# Altium footprint library ACTION标准库.pcblib: 504 footprints (part 26 of 32)
Each footprint in its own frame and in the unit in brackets; x right, y up, seen from the top. Pads: shape width x height; smd on the part's side, far side on the other; paste and mask are expansions set on the pad; w line width, h text height; cw(c..) or ccw(c..) is an arc to the next point about the centre after c.
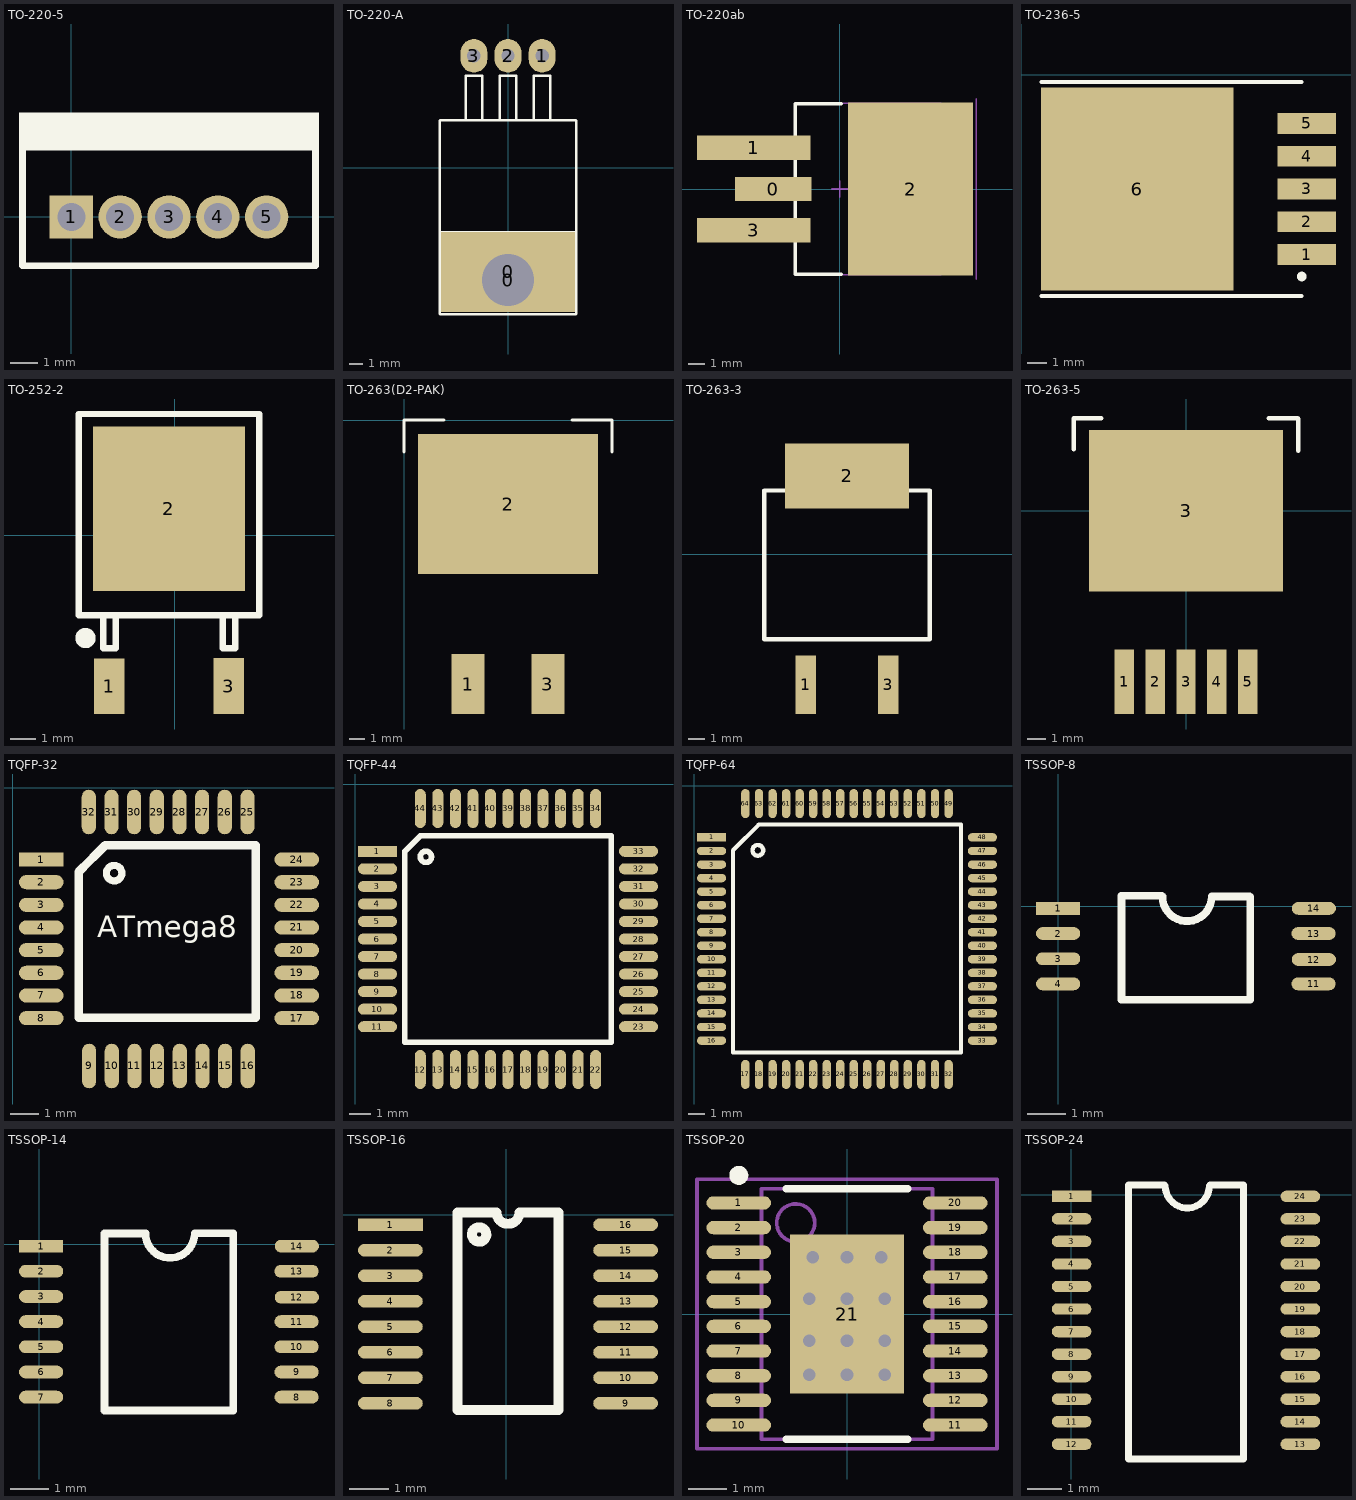
[diagram p25: the footprints below, top view; thin cyan lines are the x and y axes]

## TO-220-5 [mil]
pads (5):
  rect 62x62 hole 40: 1(0,0)
  round 62 hole 40: 2(70,0) 3(140,0) 4(210,0) 5(280,0)
Top Overlay:
  rectangle: -75,100 355,150
  lines w10: -70,-70 -70,100 350,100 350,-70 -70,-70
3D body "TO-220-5.STEP": height 269.78, standoff -143.39, extent -58.04,-786.01 342.04,8

## TO-220-A [mm]
pads (5):
  rect 10x6 smd: 0(0,-7.759)
  round 2 hole 3.88: 0(0,-8.37)
  oval 2x2.5 hole 1: 1(2.54,8.37) 2(0,8.37) 3(-2.54,8.37)
Top Overlay:
  lines w0.2: -5.08,-10.86 -5.08,-4.86 ; -5.08,-4.76 -5.08,3.52 ; -5.03,-10.91 5.03,-10.91 ; -5.03,-4.81 5.03,-4.81 ; -5.03,3.57 5.03,3.57 ; -3.15,3.57 -3.15,6.87 -1.93,6.87 -1.93,3.57 ; -0.61,3.57 -0.61,6.87 0.61,6.87 0.61,3.57 ; 1.93,3.57 1.93,6.87 3.15,6.87 3.15,3.57 ; 5.08,-10.86 5.08,-4.86 ; 5.08,-4.76 5.08,3.52
3D body "TO-220.step": height 4.45, standoff -1.79, extent -5.01,-10.69 5.15,8.59

## TO-220ab [mm] "D2-PAK, 1-Pads, Body 9.0x10.5mm (max), IPC Medium Density"
height 4.69
pads (4):
  rect 4.7x1.5 smd: 0(-4.1,0)
  rect 7x1.5 smd: 1(-5.3,2.54) 3(-5.3,-2.54)
  rect 7.7x10.65 smd: 2(4.35,0)
Top Overlay:
  lines w0.2: 0.1,-5.25 -2.75,-5.25 -2.75,5.25 0.1,5.25
Mechanical 13:
  lines w0.1: -2.75,-5.275 -2.75,5.275 6.25,5.275 6.25,-5.275 -2.75,-5.275
Mechanical 15:
  lines w0.1: -0.5,0 0.5,0 ; 0,-0.5 0,0.5 ; 8.4,-5.55 8.4,5.55

## TO-236-5 [mil] "SOT223, 6-Leads, Body 10.7x15.9mm (max), Pitch 1.70mm, IPC Medium Density"
height 177.17
pads (6):
  rect 120x42 smd: 1(583.28,-367.4) 2(583.28,-300.47) 3(583.28,-233.54) 4(583.28,-166.61) 5(583.28,-99.68)
  rect 393.7x414 smd: 6(237.28,-233.54)
Top Overlay:
  circle w9.84: c573.28,-412.32 r4.92
  lines w7.87: 41.79,-452.04 573.28,-452.04 ; 41.79,-15.03 573.28,-15.03
3D body "TO263-5.STEP": height 175.3, standoff -13.67, extent 15,-429.85 631.93,-36.15

## TO-252-2 [mm] "180度编带包装"
pads (3):
  rect 1.2x2.2 smd: 1(-2.59,-5.969) 3(2.133,-5.965)
  rect 6x6.5 smd: 2(-0.229,1.031)
Top Overlay:
  circle w0.4: c-3.529,-4.069 r0.2
  lines w0.254: -2.829,-3.169 -2.829,-4.469 -2.329,-4.469 -2.329,-3.169 ; 1.894,-3.165 1.894,-4.465 2.394,-4.465 2.394,-3.165 ; -3.802,-3.169 -3.802,4.781 3.344,4.781 3.344,-3.169 -3.802,-3.169
3D body "TO-252.STEP": height 2.44, standoff 0.03, extent -3.499,-6.169 3.041,3.769

## TO-263(D2-PAK) [mil]
pads (3):
  rect 82x150 smd: 1(160,-660) 3(360,-660)
  rect 450x350 smd: 2(260,-210)
Top Overlay:
  lines w8: 0,-80 0,0 100,0 ; 420,0 520,0 520,-80
3D body "SW3dPS-DPAK.STEP": height 193.9, standoff -3.66, extent 61,-638.71 461,-37.78

## TO-263-3 [mm]
height 1.1
pads (3):
  rect 1.25x3.6 smd: 1(8.255,-8.001) 3(13.335,-8.001)
  rect 7.6x4 smd: 2(10.795,4.826)
Top Overlay:
  lines w0.254: 5.715,-5.207 5.715,3.937 15.875,3.937 15.875,-5.207 5.715,-5.207
3D body "User Library-DPAK.step": height 4.88, standoff -0.13, extent 5.715,-9.041 15.875,6.223

## TO-263-5 [mil]
pads (6):
  rect 42x140 smd: 1(-134,-370) 2(-67,-370) 3(0,-370) 4(67,-370) 5(134,-370)
  rect 420x350 smd: 3(0,0)
Top Overlay:
  lines w10: -243,134 -243,201 -184,201 ; 179,201 242,201 243,200 243,130
3D body "TO263-5.STEP": height 185.3, standoff -3.67, extent -192.7,-424.47 201,192.47

## TQFP-32 [mil]
pads (32):
  rect 62x19.68 smd: 1(40,-100)
  oval 62x19.68 smd: 2(40,-131.5) 3(40,-162.99) 4(40,-194.49) 5(40,-225.98) 6(40,-257.48) 7(40,-288.98) 8(40,-320.47) 17(395,-320.47) 18(395,-288.98) 19(395,-257.48) 20(395,-225.98) 21(395,-194.49) 22(395,-162.99) 23(395,-131.5) 24(395,-100)
  oval 19.68x62 smd: 9(106.51,-387) 10(138.01,-387) 11(169.5,-387) 12(201,-387) 13(232.5,-387) 14(263.99,-387) 15(295.49,-387) 16(326.98,-387) 25(326.52,-33.95) 26(295.02,-33.95) 27(263.53,-33.95) 28(232.03,-33.95) 29(200.53,-33.95) 30(169.04,-33.95) 31(137.54,-33.95) 32(106.05,-33.95)
Top Overlay:
  circle w10: c141.23,-119 r10.77
  lines w12: 93,-116 129,-80 338,-80 338,-320 92,-320 92,-117 98.99,-110.01
  text "ATmega8" at 118,-208 h30
3D body "TQFP-9X9-32.STEP": height 62.99, standoff -1.97, extent 39.84,-387.33 394.16,-33

## TQFP-44 [mil]
pads (44):
  rect 70x19.68 smd: 1(40,-120)
  oval 70x19.68 smd: 2(40,-151.5) 3(40,-182.99) 4(40,-214.49) 5(40,-245.98) 6(40,-277.48) 7(40,-308.98) 8(40,-340.47) 9(40,-371.97) 10(40,-403.46) 11(40,-434.96) 23(508.5,-434.96) 24(508.5,-403.46) 25(508.5,-371.97) 26(508.5,-340.47) 27(508.5,-308.98) 28(508.5,-277.48) 29(508.5,-245.98) 30(508.5,-214.49) 31(508.5,-182.99) 32(508.5,-151.5) 33(508.5,-120)
  oval 19.68x70 smd: 12(116.77,-511.73) 13(148.27,-511.73) 14(179.76,-511.73) 15(211.26,-511.73) 16(242.76,-511.73) 17(274.25,-511.73) 18(305.75,-511.73) 19(337.24,-511.73) 20(368.74,-511.73) 21(400.24,-511.73) 22(431.73,-511.73) 34(431.73,-43.23) 35(400.24,-43.23) 36(368.74,-43.23) 37(337.24,-43.23) 38(305.75,-43.23) 39(274.25,-43.23) 40(242.76,-43.23) 41(211.26,-43.23) 42(179.76,-43.23) 43(148.27,-43.23) 44(116.77,-43.23)
Top Overlay:
  circle w10: c126.95,-130 r10.05
  lines w9.84: 89.21,-462.52 459.29,-462.52 459.29,-92.44
  lines w10: 89.21,-462.52 89.21,-120 116.77,-92.44 459.29,-92.44
3D body "TQFP-44.STEP": height 42.69, standoff -1.02, extent 39.79,-515.21 512.23,-42.77

## TQFP-64 [mm]
pads (64):
  rect 1.724x0.5 smd: 1(1.016,-3.044)
  oval 1.724x0.5 smd: 2(1.016,-3.844) 3(1.016,-4.644) 4(1.016,-5.444) 5(1.016,-6.244) 6(1.016,-7.044) 7(1.016,-7.844) 8(1.016,-8.644) 9(1.016,-9.444) 10(1.016,-10.244) 11(1.016,-11.044) 12(1.016,-11.844) 13(1.016,-12.644) 14(1.016,-13.444) 15(1.016,-14.244) 16(1.016,-15.044) 33(17.016,-15.044) 34(17.016,-14.244) 35(17.016,-13.444) 36(17.016,-12.644) 37(17.016,-11.844) 38(17.016,-11.044) 39(17.016,-10.244) 40(17.016,-9.444) 41(17.016,-8.644) 42(17.016,-7.844) 43(17.016,-7.044) 44(17.016,-6.244) 45(17.016,-5.444) 46(17.016,-4.644) 47(17.016,-3.844) 48(17.016,-3.044)
  oval 0.5x1.724 smd: 17(3.016,-17.044) 18(3.816,-17.044) 19(4.616,-17.044) 20(5.416,-17.044) 21(6.216,-17.044) 22(7.016,-17.044) 23(7.816,-17.044) 24(8.616,-17.044) 25(9.416,-17.044) 26(10.216,-17.044) 27(11.016,-17.044) 28(11.816,-17.044) 29(12.616,-17.044) 30(13.416,-17.044) 31(14.216,-17.044) 32(15.016,-17.044) 49(15.016,-1.044) 50(14.216,-1.044) 51(13.416,-1.044) 52(12.616,-1.044) 53(11.816,-1.044) 54(11.016,-1.044) 55(10.216,-1.044) 56(9.416,-1.044) 57(8.616,-1.044) 58(7.816,-1.044) 59(7.016,-1.044) 60(6.216,-1.044) 61(5.416,-1.044) 62(4.616,-1.044) 63(3.816,-1.044) 64(3.016,-1.044)
Top Overlay:
  circle w0.254: c3.748,-3.806 r0.316
  lines w0.254: 2.286,-15.744 2.286,-3.806 3.81,-2.282 15.748,-2.282 15.748,-15.744 2.286,-15.744
3D body "User Library-TQFP64-1.STEP": height 1.36, standoff 0, extent 0.893,-17.12 17.141,-0.871

## TSSOP-8 [mil]
pads (8):
  rect 45x12.99 smd: 1(-0.16,-2)
  oval 45x12.99 smd: 2(-0.16,-27.59) 3(-0.16,-53.18) 4(-0.16,-78.77) 11(259.69,-78.77) 12(260,-54) 13(259.69,-27.59) 14(260,-2)
Top Overlay:
  lines w7.87: 105.2,10.79 64.21,10.79 64.21,-94.88 195.31,-94.88 195.31,9.84 ; 106,10 ccw(c131,10) 156,10 194.52,10
3D body "TSS0P-8.STEP": height 43, standoff 0, extent 7.38,-99 254.62,19.11

## TSSOP-14 [mil]
pads (14):
  rect 45x12.99 smd: 1(1.84,-2)
  oval 45x12.99 smd: 2(1.84,-27.59) 3(1.84,-53.18) 4(1.84,-78.77) 5(1.84,-104.36) 6(1.84,-129.95) 7(1.84,-155.54) 8(261.69,-155.54) 9(261.69,-129.95) 10(261.69,-104.36) 11(261.69,-78.77) 12(262,-54) 13(261.69,-27.59) 14(262,-2)
Top Overlay:
  lines w7.87: 107.64,10.79 66.21,10.79 66.21,-169.29 197.31,-169.29 197.31,10.79 ; 108,11 ccw(c133,11) 158,11 197.11,11
3D body "User Library-TSSOP-14.STEP": height 47.24, standoff 0, extent 7.03,-177.43 258.99,19.43

## TSSOP-16 [mil]
pads (16):
  rect 65x12.5 smd: 1(-116,-10)
  oval 65x12.5 smd: 2(-116,-35.59) 3(-116,-61.18) 4(-116,-86.77) 5(-116,-112.36) 6(-116,-137.95) 7(-116,-163.54) 8(-116,-189.13) 9(120,-189.13) 10(120,-163.54) 11(120,-137.95) 12(120,-112.36) 13(120,-86.77) 14(120,-61.18) 15(120,-35.59) 16(120,-10)
Top Overlay:
  lines w10: -27,-27 cw(c-27,-19.79) -25.98,-26.93 ; -48.5,-196 -48.5,2.5 -9.54,2.5 ccw(c2,2.5) 13.54,2.5 52.5,2.5 52.5,-196 -48.5,-196
3D body "User Library-TSSOP-16-2.STEP": height 47.24, standoff 0, extent -122.98,-197.43 128.99,-0.58

## TSSOP-20 [mm]
pads (21):
  oval 1.7x0.35 smd: 1(-2.85,2.925) 2(-2.85,2.275) 3(-2.85,1.625) 4(-2.85,0.975) 5(-2.85,0.325) 6(-2.85,-0.325) 7(-2.85,-0.975) 8(-2.85,-1.625) 9(-2.85,-2.275) 10(-2.85,-2.925) 11(2.85,-2.925) 12(2.85,-2.275) 13(2.85,-1.625) 14(2.85,-0.975) 15(2.85,-0.325) 16(2.85,0.325) 17(2.85,0.975) 18(2.85,1.625) 19(2.85,2.275) 20(2.85,2.925)
  rect 3x4.2 smd: 21(0,0)
via 0,1.5 diameter 0.5 hole 0.33
via 0.9,1.5 diameter 0.5 hole 0.33
via -1,0.4 diameter 0.5 hole 0.33
via 0,0.4 diameter 0.5 hole 0.33
via 1,0.4 diameter 0.5 hole 0.33
via -0.9,1.5 diameter 0.5 hole 0.33
via -1,-0.7 diameter 0.5 hole 0.33
via -1,-1.6 diameter 0.5 hole 0.33
via 0,-0.7 diameter 0.5 hole 0.33
via 0,-1.6 diameter 0.5 hole 0.33
via 1,-0.7 diameter 0.5 hole 0.33
via 1,-1.6 diameter 0.5 hole 0.33
Top Overlay:
  circle w0.25: c-2.85,3.65 r0.125
  lines w0.2: -1.6,-3.3 1.6,-3.3 ; -1.6,3.3 1.6,3.3
Mechanical 5:
  circle w0.1: c-1.35,2.4 r0.5
  lines w0.1: -2.25,-3.3 -2.25,3.3 2.25,3.3 2.25,-3.3 -2.25,-3.3
Mechanical 15:
  lines w0.1: -0.5,0 0.5,0 ; 0,-0.5 0,0.5 ; -3.95,-3.55 -3.95,3.55 3.95,3.55 3.95,-3.55 -3.95,-3.55
3D body "TSSOP20.STEP": height 1.1, standoff -0.09, extent -3.156,-3.377 3.124,3.123

## TSSOP-24 [mm]
pads (24):
  rect 1.143x0.33 smd: 1(0.016,-0.046)
  oval 1.143x0.33 smd: 2(0.016,-0.696) 3(0.016,-1.346) 4(0.016,-1.996) 5(0.016,-2.646) 6(0.016,-3.296) 7(0.016,-3.946) 8(0.016,-4.596) 9(0.016,-5.246) 10(0.016,-5.896) 11(0.016,-6.546) 12(0.016,-7.196) 13(6.616,-7.196) 14(6.616,-6.546) 15(6.616,-5.896) 16(6.616,-5.246) 17(6.616,-4.596) 18(6.616,-3.946) 19(6.616,-3.296) 20(6.616,-2.646) 21(6.616,-1.996) 22(6.616,-1.346) 23(6.616,-0.696) 24(6.616,-0.046)
Top Overlay:
  lines w0.2: 2.692,0.279 1.651,0.279 1.651,-7.62 4.981,-7.62 4.981,0.279 4.013,0.279 ; 2.718,0.254 ccw(c3.353,0.254) 3.988,0.254
3D body "User Library-SOT340-1.STEP": height 1.89, standoff -0.01, extent -0.473,-7.774 7.077,0.459